# Altium footprint library cool_library.PcbLib: 1182 footprints (part 9 of 75)
Each footprint in its own frame and in the unit in brackets; x right, y up, seen from the top. Pads: shape width x height; smd on the part's side, far side on the other; paste and mask are expansions set on the pad; w line width, h text height; cw(c..) or ccw(c..) is an arc to the next point about the centre after c.
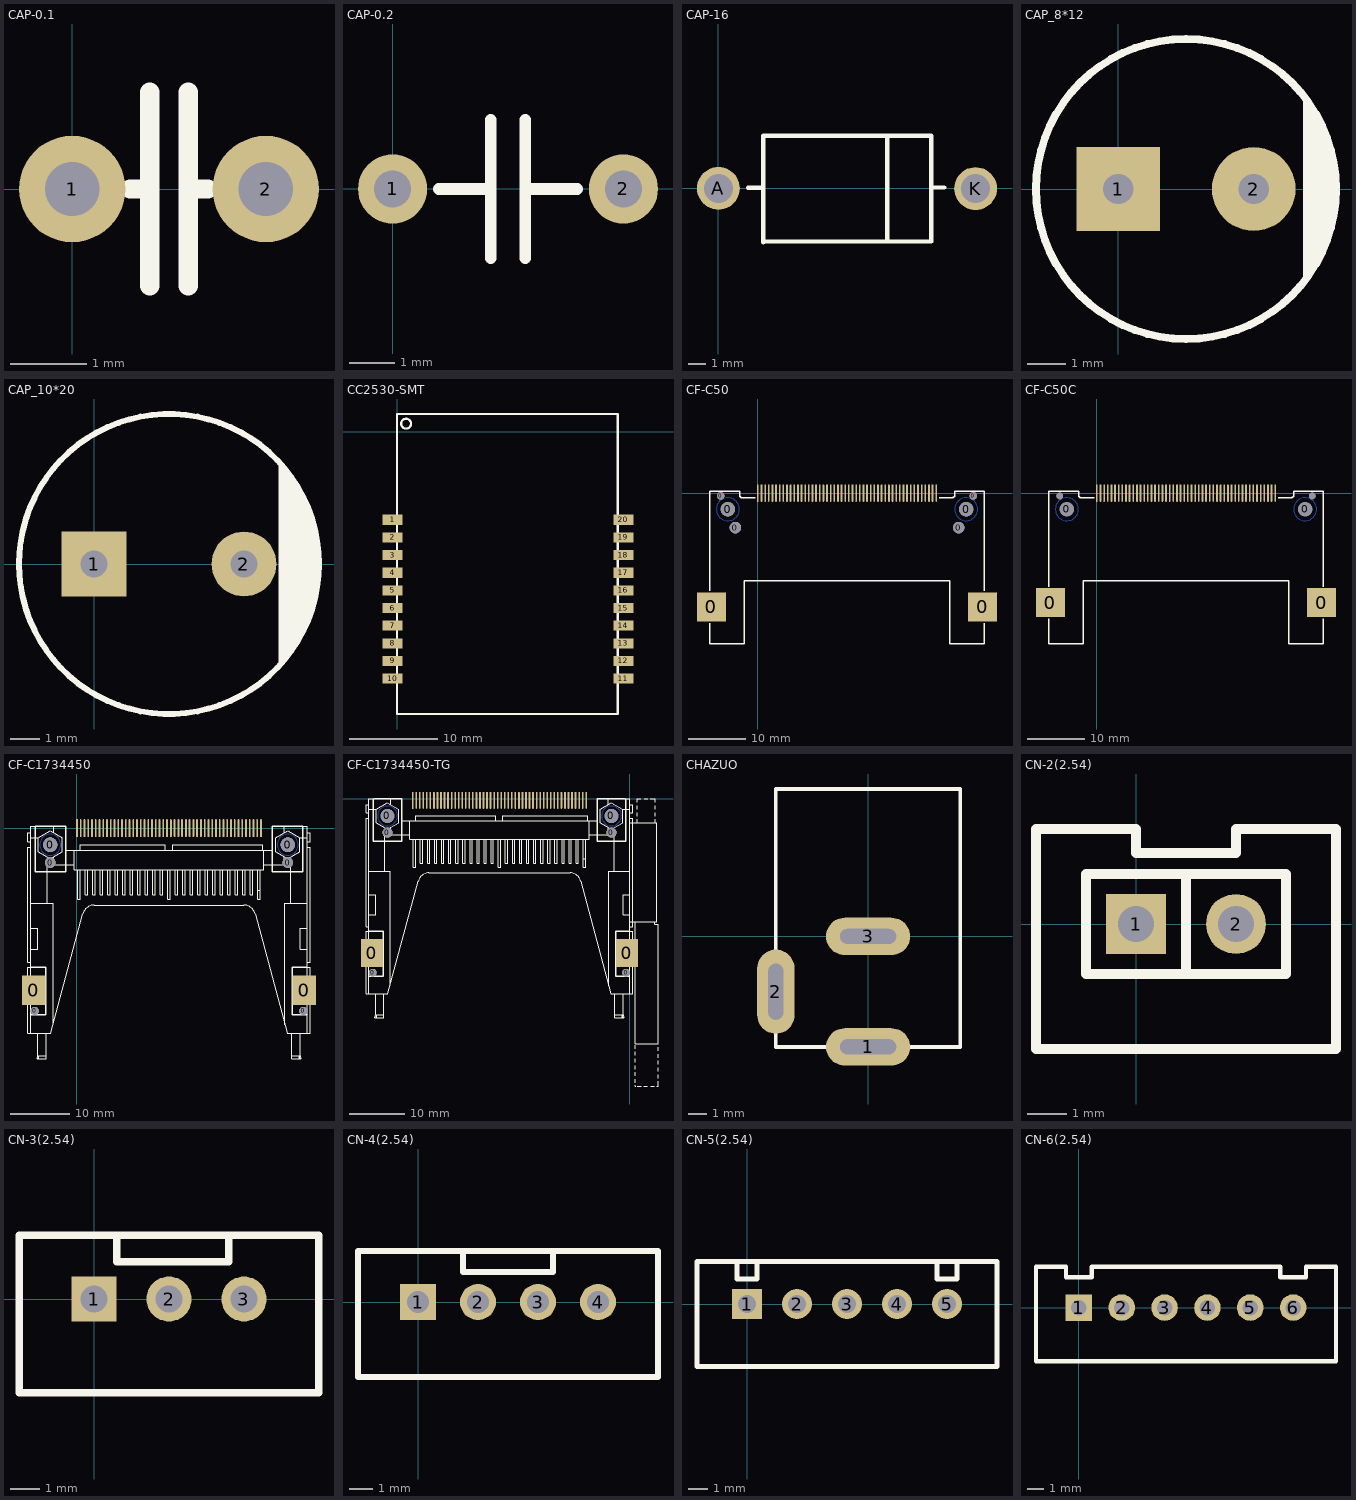
[diagram p8: the footprints below, top view; thin cyan lines are the x and y axes]

## CAP-0.1 [mil]
pads (2):
  round 55 hole 28: 1(0,0) 2(100,0)
Top Overlay:
  lines w10: 30,0 40,0 ; 40,-50 40,50 ; 60,-50 60,50 ; 60,0 70,0

## CAP-0.2 [mil]
pads (2):
  round 60 hole 32: 1(0,0) 2(200,0)
Top Overlay:
  lines w10: 40,0 85,0 ; 85,-60 85,60 ; 115,-60 115,60 ; 115,0 160,0

## CAP-16 [mm]
pads (2):
  round 2.5 hole 1.7: A(0,0) K(15,-0.013)
Top Overlay:
  lines w0.254: 1.727,0.025 2.616,0.025 ; 2.616,-3.15 2.616,3.073 12.421,3.073 12.421,-3.099 2.667,-3.099 ; 9.855,-3.099 9.855,3.073 ; 12.421,0.051 13.183,0.051

## CAP_8*12 [mm]
height 8.23
pads (2):
  rect 2.2x2.2 hole 0.8: 1(0,0)
  round 2.2 hole 0.8: 2(3.556,0)
Top Overlay:
  circle w0.203: c1.778,0 r3.937
  lines w0.203: 4.953,-2.286 4.953,2.286 ; 5.08,-1.905 5.08,1.905 5.207,1.778 5.207,-1.778 ; 5.207,1.524 5.334,1.397 5.334,-1.651 ; 5.334,1.143 5.461,1.016 5.461,-1.143 ; 5.461,0.635 5.588,0.508 5.588,-0.635

## CAP_10*20 [mm]
height 8.23
pads (2):
  rect 2.2x2.2 hole 0.9: 1(0,0)
  round 2.2 hole 0.9: 2(5.08,0)
Top Overlay:
  circle w0.203: c2.54,0 r5.08
  lines w0.203: 6.35,-3.302 6.35,3.302 ; 6.477,-3.048 6.477,3.048 6.604,2.921 6.604,-2.921 ; 6.731,2.794 6.731,-2.667 ; 6.858,2.54 6.858,-2.54 6.731,-2.667 ; 6.985,2.286 6.985,-2.413 6.731,-2.667 ; 7.112,-2.032 7.112,2.159 ; 7.239,-1.905 7.239,1.651 ; 7.366,-1.27 7.366,1.27 ; 7.493,-0.762 7.493,0.762

## CC2530-SMT [mil]
pads (20):
  rect 90x45 smd: 1(-20,-393.23) 2(-20,-471.97) 3(-20,-550.71) 4(-20,-629.45) 5(-20,-708.19) 6(-20,-786.93) 7(-20,-865.67) 8(-20,-944.41) 9(-20,-1023.15) 10(-20,-1101.89) 11(1010,-1101.89) 12(1010,-1023.15) 13(1010,-944.41) 14(1010,-865.67) 15(1010,-786.93) 16(1010,-708.19) 17(1010,-629.45) 18(1010,-550.71) 19(1010,-471.97) 20(1010,-393.23)
Top Overlay:
  circle w10: c40.16,35.51 r22.01
  lines w10: 0,-1259.84 984.25,-1259.84 984.25,78.74 0,78.74 0,-1259.84

## CF-C50 [mil]
pads (58):
  rect 196.85x196.85 smd: 0(-318,-779) 0(1538,-779)
  round 51.18 hole 51.18: 0(-254,-20) 0(1474,-20)
  round 98.42 hole 98.42: 0(-205,-111) 0(1425,-111)
  round 78.74 hole 78.74: 0(-153.54,-236.22) 0(1374.02,-236.22)
  rect 12x120 smd: 1(0,0)
  oval 12x120 smd: 2(49.81,0) 3(99.63,0) 4(149.44,0) 5(199.26,0) 6(249.07,0) 7(298.89,0) 8(348.7,0) 9(398.52,0) 10(448.33,0) 11(498.15,0) 12(547.97,0) 13(597.78,0) 14(647.6,0) 15(697.41,0) 16(747.23,0) 17(797.04,0) 18(846.86,0) 19(896.67,0) 20(946.49,0) 21(996.3,0) 22(1046.12,0) 23(1095.93,0) 24(1145.74,0) 25(1195.56,0) 26(24.91,0) 27(74.72,0) 28(124.54,0) 29(174.35,0) 30(224.17,0) 31(273.98,0) 32(323.8,0) 33(373.61,0) 34(423.43,0) 35(473.24,0) 36(523.06,0) 37(572.87,0) 38(622.69,0) 39(672.5,0) 40(722.32,0) 41(772.13,0) 42(821.95,0) 43(871.76,0) 44(921.58,0) 45(971.39,0) 46(1021.21,0) 47(1071.02,0) 48(1120.84,0) 49(1170.65,0) 50(1220.47,0)
Bottom Layer:
  circle w5: c-205,-111 r78.74
  circle w5: c1425,-111 r78.74
Top Overlay:
  lines w10: -328,-890 -328,-1031.31 -91.78,-1031.31 -91.78,-600.78 1313.73,-600.78 1313.73,-1031.31 1549.95,-1031.31 1549.95,-890 ; -328,-669 -328,12 -124,12 -124,-22 -112,-34 -19,-34 ; 1240.95,-34 1333.95,-34 1345.95,-22 1345.95,12 1549.95,12 1549.95,-669

## CF-C50C [mil]
pads (56):
  rect 196.85x196.85 smd: 0(-318,-750) 0(1538,-750)
  round 45 hole 45.28: 0(-254,-20) 0(1474,-20)
  round 95 hole 98: 0(-205,-111) 0(1425,-111)
  rect 12x120 smd: 1(0,0)
  oval 12x120 smd: 2(49.81,0) 3(99.63,0) 4(149.44,0) 5(199.26,0) 6(249.07,0) 7(298.89,0) 8(348.7,0) 9(398.52,0) 10(448.33,0) 11(498.15,0) 12(547.97,0) 13(597.78,0) 14(647.6,0) 15(697.41,0) 16(747.23,0) 17(797.04,0) 18(846.86,0) 19(896.67,0) 20(946.49,0) 21(996.3,0) 22(1046.12,0) 23(1095.93,0) 24(1145.74,0) 25(1195.56,0) 26(24.91,0) 27(74.72,0) 28(124.54,0) 29(174.35,0) 30(224.17,0) 31(273.98,0) 32(323.8,0) 33(373.61,0) 34(423.43,0) 35(473.24,0) 36(523.06,0) 37(572.87,0) 38(622.69,0) 39(672.5,0) 40(722.32,0) 41(772.13,0) 42(821.95,0) 43(871.76,0) 44(921.58,0) 45(971.39,0) 46(1021.21,0) 47(1071.02,0) 48(1120.84,0) 49(1170.65,0) 50(1220.47,0)
Bottom Layer:
  circle w5: c-205,-111 r78.74
  circle w5: c1425,-111 r78.74
Top Overlay:
  lines w10: -328,-860 -328,-1031.31 -91.78,-1031.31 -91.78,-600.78 1313.73,-600.78 1313.73,-1031.31 1549.95,-1031.31 1549.95,-860 ; -328,-640 -328,12 -124,12 -124,-22 -112,-34 -19,-34 ; 1240.95,-34 1333.95,-34 1345.95,-22 1345.95,12 1549.95,12 1549.95,-640

## CF-C1734450 [mil]
pads (58):
  rect 157.48x196.85 smd: 0(-287.5,-1078.72) 0(1512.82,-1078.72)
  round 55.12 hole 55.12: 0(-281.2,-1216.91) 0(1506.52,-1216.91)
  round 70.87 hole 70.87: 0(-177.89,-228.72) 0(1403.21,-228.72)
  round 95 hole 98: 0(-177.89,-110.61) 0(1403.21,-110.61)
  rect 12x120 smd: 1(0,0)
  oval 12x120 smd: 2(50,0) 3(100,0) 4(150,0) 5(200,0) 6(250,0) 7(300,0) 8(350,0) 9(400,0) 10(450,0) 11(500,0) 12(550,0) 13(600,0) 14(650,0) 15(700,0) 16(750,0) 17(800,0) 18(850,0) 19(900,0) 20(950,0) 21(1000,0) 22(1050,0) 23(1100,0) 24(1150,0) 25(1200,0) 26(25,0) 27(75,0) 28(125,0) 29(175,0) 30(225,0) 31(275,0) 32(325,0) 33(375,0) 34(425,0) 35(475,0) 36(525,0) 37(575,0) 38(625,0) 39(675,0) 40(725,0) 41(775,0) 42(825,0) 43(875,0) 44(925,0) 45(975,0) 46(1025,0) 47(1075,0) 48(1125,0) 49(1175,0) 50(1225,0)
Bottom Layer:
  circle w5: c-177.89,-110.61 r70
  circle w5: c1403.21,-110.61 r70
Top Overlay:
  drawing of 189 lines, arcs and shapes, not listed

## CF-C1734450-TG [mil]
pads (58):
  rect 157.48x196.85 smd: 0(-1821.42,-1090.16) 0(-21.1,-1090.16)
  round 55.12 hole 55.12: 0(-1815.12,-1228.35) 0(-27.4,-1228.35)
  round 70.87 hole 70.87: 0(-1711.81,-240.16) 0(-130.71,-240.16)
  round 95 hole 98: 0(-1711.81,-122.05) 0(-130.71,-122.05)
  rect 12x120 smd: 1(-1533.92,-11.44)
  oval 12x120 smd: 2(-1483.92,-11.44) 3(-1433.92,-11.44) 4(-1383.92,-11.44) 5(-1333.92,-11.44) 6(-1283.92,-11.44) 7(-1233.92,-11.44) 8(-1183.92,-11.44) 9(-1133.92,-11.44) 10(-1083.92,-11.44) 11(-1033.92,-11.44) 12(-983.92,-11.44) 13(-933.92,-11.44) 14(-883.92,-11.44) 15(-833.92,-11.44) 16(-783.92,-11.44) 17(-733.92,-11.44) 18(-683.92,-11.44) 19(-633.92,-11.44) 20(-583.92,-11.44) 21(-533.92,-11.44) 22(-483.92,-11.44) 23(-433.92,-11.44) 24(-383.92,-11.44) 25(-333.92,-11.44) 26(-1508.92,-11.44) 27(-1458.92,-11.44) 28(-1408.92,-11.44) 29(-1358.92,-11.44) 30(-1308.92,-11.44) 31(-1258.92,-11.44) 32(-1208.92,-11.44) 33(-1158.92,-11.44) 34(-1108.92,-11.44) 35(-1058.92,-11.44) 36(-1008.92,-11.44) 37(-958.92,-11.44) 38(-908.92,-11.44) 39(-858.92,-11.44) 40(-808.92,-11.44) 41(-758.92,-11.44) 42(-708.92,-11.44) 43(-658.92,-11.44) 44(-608.92,-11.44) 45(-558.92,-11.44) 46(-508.92,-11.44) 47(-458.92,-11.44) 48(-408.92,-11.44) 49(-358.92,-11.44) 50(-308.92,-11.44)
Bottom Layer:
  circle w5: c-1711.81,-122.05 r70
  circle w5: c-130.71,-122.05 r70
Top Overlay:
  drawing of 224 lines, arcs and shapes, not listed

## CHAZUO [mil]
pads (3):
  oval 180x80 hole 32.01 slot 120 at 0 deg: 1(-0.02,-236) 3(-0.02,-0.01)
  oval 80x180 hole 32.01 slot 120 at 90 deg: 2(-197.03,-118.01)
Top Overlay:
  lines w8: -39,-236 197,-236 197,315 -197,315 -197,-236 0,-236

## CN-2(2.54) [mil]
pads (2):
  rect 60x60 hole 36: 1(0,0)
  round 60 hole 36: 2(100,0)
Top Overlay:
  lines w10: 50,-50 50,50 ; -100,-125 200,-125 200,95 100,95 100,71 0,71 0,95 -100,95 -100,-125 ; -50,-50 150,-50 150,50 -50,50 -50,-50

## CN-3(2.54) [mil]
pads (3):
  rect 60x60 hole 36: 1(0,0)
  round 60 hole 36: 2(100,0) 3(200,0)
Top Overlay:
  lines w10: 30,85 30,50 180,50 180,85 ; -100,-125 -100,85 300,85 300,-125 -100,-125

## CN-4(2.54) [mil]
pads (4):
  rect 60x60 hole 36: 1(0,0)
  round 60 hole 36: 2(100,0) 3(200,0) 4(300,0)
Top Overlay:
  lines w10: 75,85 75,50 225,50 225,85 ; -100,-125 -100,85 400,85 400,-125 -100,-125

## CN-5(2.54) [mil]
pads (5):
  rect 60x60 hole 36: 1(0,0)
  round 60 hole 36: 2(100,0) 3(200,0) 4(300,0) 5(400,0)
Top Overlay:
  lines w10: -20,85 -20,50 20,50 20,85 ; 380,85 380,50 420,50 420,85 ; -100,-125 -100,85 500,85 500,-125 -100,-125

## CN-6(2.54) [mil]
pads (6):
  rect 62x62 hole 36: 1(0,0)
  round 62 hole 36: 2(100,0) 3(200,0) 4(300,0) 5(400,0) 6(500,0)
Top Overlay:
  lines w10: -100,-125 -100,95 -30,95 -30,71 30,71 30,95 470,95 470,71 530,71 530,95 600,95 600,-125 -100,-125